# Altium footprint library Basal.PcbLib: 248 footprints (part 12 of 16)
Each footprint in its own frame and in the unit in brackets; x right, y up, seen from the top. Pads: shape width x height; smd on the part's side, far side on the other; paste and mask are expansions set on the pad; w line width, h text height; cw(c..) or ccw(c..) is an arc to the next point about the centre after c.
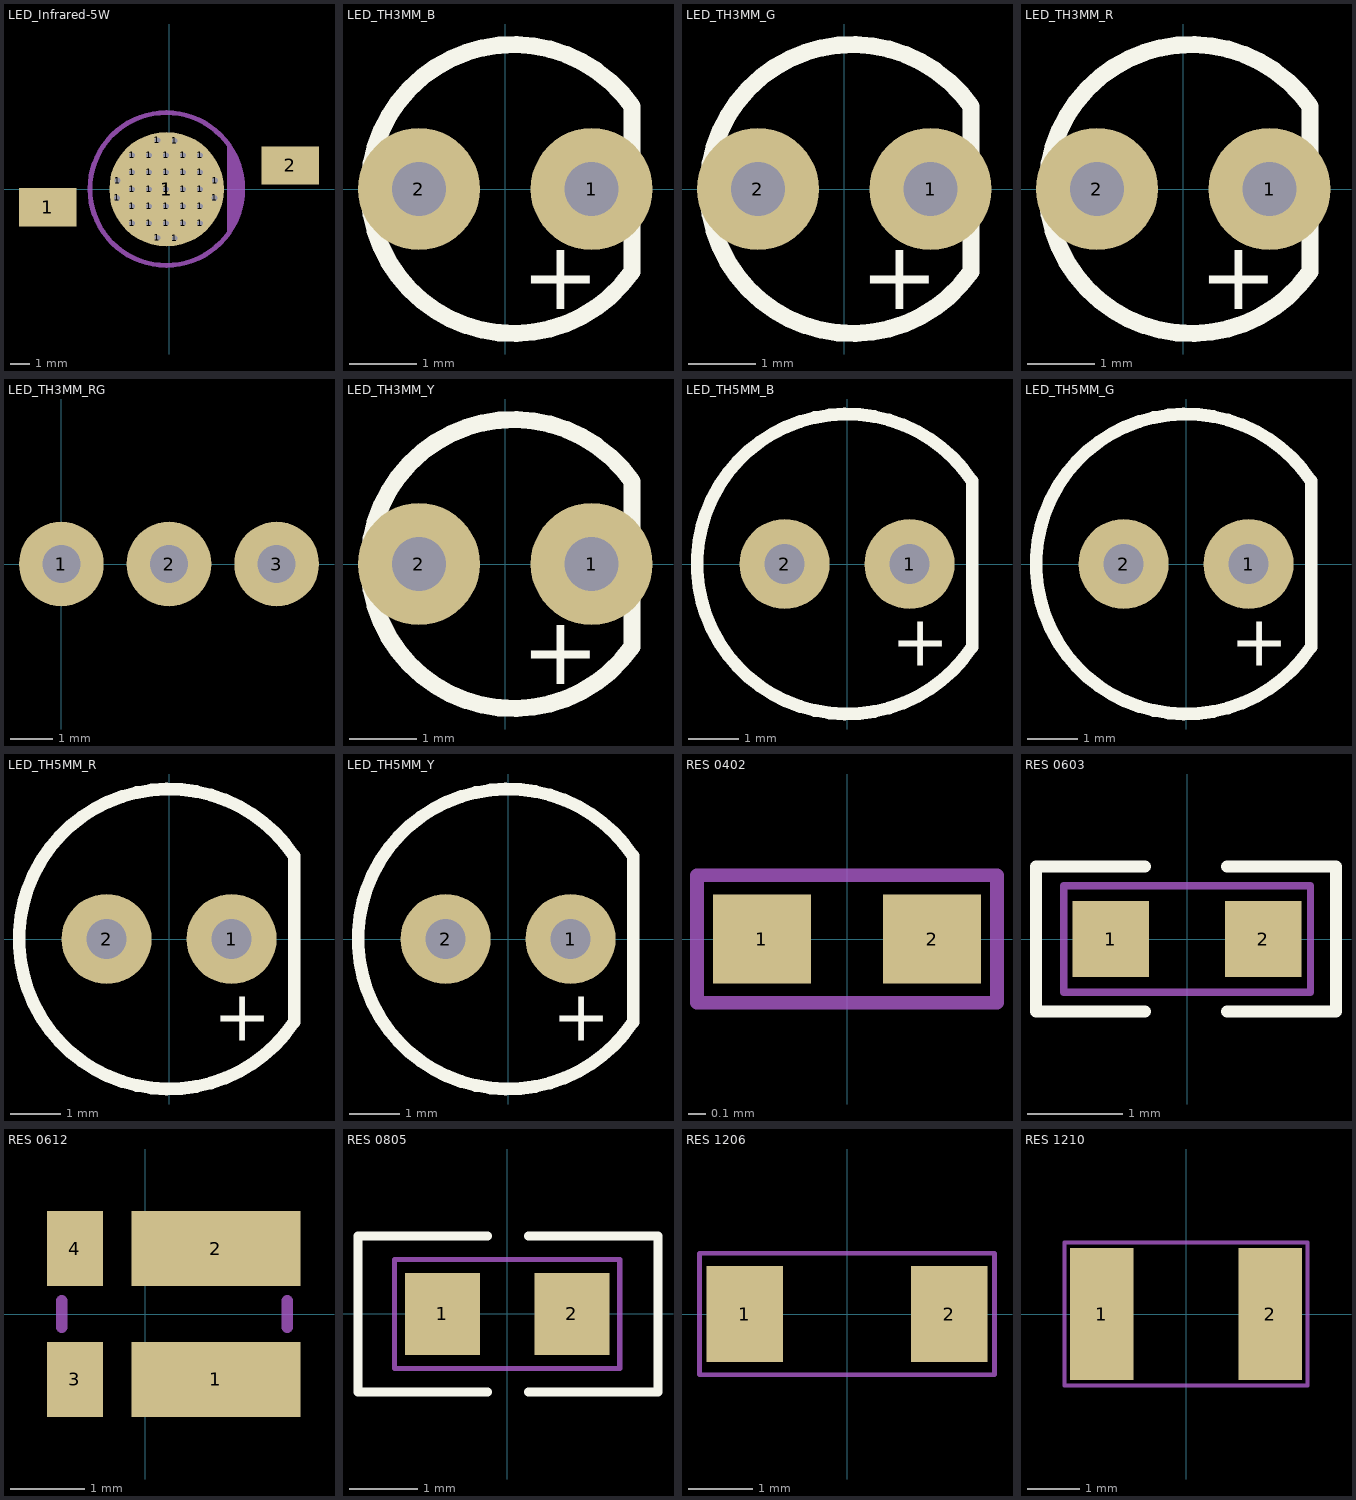
[diagram p11: the footprints below, top view; thin cyan lines are the x and y axes]

## LED_Infrared-5W [mil] "直插5MMLED_黄色"
pads (36):
  rect 118.11x78.74 smd: 1(-250.09,-37) 2(250.09,49)
  round 24 hole 12: 1(-107,-18) 1(-106,18) 1(-76,-70) 1(-76,-35) 1(-76,0) 1(-76,35) 1(-76,70) 1(-41,-70) 1(-41,-35) 1(-41,0) 1(-41,35) 1(-41,70) 1(-24,-100) 1(-24,101) 1(-6,-70) 1(-6,-35) 1(-6,0) 1(-6,35) 1(-6,70) 1(12,-101) 1(12,100) 1(29,-70) 1(29,-35) 1(29,0) 1(29,35) 1(29,70) 1(64,-70) 1(64,-35) 1(64,0) 1(64,35) 1(64,70) 1(94,-18) 1(95,18)
  round 236.22 smd: 1(-5,0)
Mechanical 15:
  circle w10: c-5.5,0.5 r157.48
  lines w10: 125,-87 125,88 ; 134,-72 134,73 ; 144,-49 144,50
  text "-" at 222.76,-67 h120
  text "+" at -277.64,-1 h120
3D body: height 59.45, standoff 47.24, extent 149.5,-64.75 165.5,-18.25
3D body: height 59.06, standoff 0, extent -226.09,-59.5 -210.09,-13.01
3D body: height 15.75, standoff 0, extent -290.09,-64.5 -210.09,-9.5
3D body: height 59.06, standoff 43.31, extent -164.5,-59.5 -115.5,60.5
3D body: height 59.06, standoff 43.31, extent 104.5,-71.25 169.5,72.25
3D body: height 102.36, standoff 0, extent -162.99,-156.94 151.98,157.93
3D body: height 236.22, standoff 15.75, extent -115.68,-109.71 104.69,110.71
3D body: height 59.06, standoff 43.31, extent -226.09,-59.5 -139.09,-13.01
3D body: height 59.06, standoff 43.31, extent 139.09,25.75 226.09,72.25
3D body: height 15.75, standoff 0, extent 210.09,21.5 290.09,76.5
3D body: height 59.06, standoff 0, extent 210.09,25.75 226.09,72.25

## LED_TH3MM_B [mm] "直插3MMLED_蓝色"
pads (2):
  round 1.8 hole 0.8: 1(1.275,0) 2(-1.275,0)
Top Overlay:
  lines w0.254: 1.871,-1.222 cw(c0.122,0) 1.873,1.218 1.871,-1.222
  text "+" at 0.238,-1.778 h1.02
3D body "BLUELED_3MM.STEP": height 2.5, standoff -8.6, extent -2.042,-2.001 1.625,1.999

## LED_TH3MM_G [mm] "直插3MMLED_绿色"
pads (2):
  round 1.8 hole 0.8: 1(1.275,0) 2(-1.275,0)
Top Overlay:
  lines w0.254: 1.871,-1.222 cw(c0.122,0) 1.873,1.218 1.871,-1.222
  text "+" at 0.238,-1.778 h1.02
3D body "GREENLED_3MM.STEP": height 2.5, standoff -8.6, extent -1.991,-1.975 1.676,2.025

## LED_TH3MM_R [mm] "直插3MMLED_红色"
pads (2):
  round 1.8 hole 0.8: 1(1.275,0) 2(-1.275,0)
Top Overlay:
  lines w0.254: 1.871,-1.222 cw(c0.122,0) 1.873,1.218 1.871,-1.222
  text "+" at 0.238,-1.778 h1.02
3D body "REDLED_3MM.STEP": height 8.1, standoff -3, extent -1.991,-2.001 1.676,1.999

## LED_TH3MM_RG [mm] "直插弯3MMLED_RG"
height 0.5
pads (3):
  round 2 hole 0.9: 1(0,0) 2(2.54,0) 3(5.08,0)
3D body "User Library-LED RG弯.STEP": height 4.1, standoff -1.65, extent 0.225,-0.249 4.725,8.681

## LED_TH3MM_Y [mm] "直插3MMLED_黄色"
pads (2):
  round 1.8 hole 0.8: 1(1.275,0) 2(-1.275,0)
Top Overlay:
  lines w0.254: 1.871,-1.222 cw(c0.122,0) 1.873,1.218 1.871,-1.222
  text "+" at 0.238,-1.778 h1.02
3D body "YELLOWLED_3MM.STEP": height 8.1, standoff -3, extent -1.991,-2.001 1.676,1.999

## LED_TH5MM_B [mm] "直插5MMLED_黄色"
pads (2):
  round 1.8 hole 0.8: 1(1.25,0) 2(-1.25,0)
Top Overlay:
  lines w0.254: 2.497,-1.658 cw(c-0.003,0) 2.497,1.658 ; 2.5,-1.66 2.5,1.66
  text "+" at 0.886,-2.032 h1.02
3D body "BLUE_5MM.STEP": height 12.6, standoff -3, extent -2.953,-2.946 2.947,2.954

## LED_TH5MM_G [mm] "直插5MMLED_绿色"
pads (2):
  round 1.8 hole 0.8: 1(1.25,0) 2(-1.25,0)
Top Overlay:
  lines w0.254: 2.497,-1.658 cw(c-0.003,0) 2.497,1.658 ; 2.5,-1.66 2.5,1.66
  text "+" at 0.886,-2.032 h1.02
3D body "GREENLED_5MM.STEP": height 12.6, standoff -3, extent -2.953,-2.921 2.947,2.979

## LED_TH5MM_R [mm] "直插5MMLED_红色、"
pads (2):
  round 1.8 hole 0.8: 1(1.25,0) 2(-1.25,0)
Top Overlay:
  lines w0.254: 2.497,-1.658 cw(c-0.003,0) 2.497,1.658 ; 2.5,-1.66 2.5,1.66
  text "+" at 0.886,-2.032 h1.02
3D body "REDLED_5MM.STEP": height 12.6, standoff -3, extent -2.953,-2.95 2.947,2.95

## LED_TH5MM_Y [mm] "直插5MMLED_黄色"
pads (2):
  round 1.8 hole 0.8: 1(1.25,0) 2(-1.25,0)
Top Overlay:
  lines w0.254: 2.497,-1.658 cw(c-0.003,0) 2.497,1.658 ; 2.5,-1.66 2.5,1.66
  text "+" at 0.886,-2.032 h1.02
3D body "YELLOWLED_5MM.STEP": height 12.6, standoff -3, extent -2.928,-2.976 2.972,2.924

## RES 0402 [mm] "贴片电阻0402封装"
height 0.3
pads (2):
  rect 0.55x0.5 smd: 1(-0.475,0) 2(0.475,0)
Mechanical 15:
  lines w0.076: -0.838,-0.356 -0.838,0.356 0.838,0.356 0.838,-0.356 -0.838,-0.356
3D body "R0402.STEP": height 0.36, standoff 0, extent -0.495,-0.254 0.495,0.254

## RES 0603 [mm] "贴片电阻0603封装"
height 0.4
pads (2):
  rect 0.8x0.8 smd paste-1: 1(-0.8,0) 2(0.8,0)
Top Overlay:
  lines w0.127: -0.443,-0.762 -1.586,-0.762 -1.586,0.762 -0.443,0.762 ; 0.421,-0.762 1.564,-0.762 1.564,0.762 0.421,0.762
Top Paste:
  region: -0.419,-0.15 -0.719,-0.368 -1.169,-0.368 -1.169,0.368 -0.719,0.368 -0.419,0.15
  region: 0.419,0.15 0.719,0.368 1.169,0.368 1.169,-0.368 0.719,-0.368 0.419,-0.15
Mechanical 15:
  lines w0.076: -1.295,-0.559 1.295,-0.559 1.295,0.559 -1.295,0.559 -1.295,-0.559
3D body "R0603.STEP": height 0.51, standoff 0, extent -0.8,-0.406 0.8,0.407

## RES 0612 [mm] "贴片电阻2512封装"
height 0.6
pads (4):
  rect 2.287x1.01 smd: 1(0.953,-0.885) 2(0.953,0.885)
  rect 0.762x1.01 smd: 3(-0.953,-0.885) 4(-0.953,0.885)
Mechanical 15:
  lines w0.152: -1.13,-0.18 -1.13,0.18 ; 1.92,-0.18 1.92,0.18
3D body "R0612.stp": height 0.65, standoff 0, extent -1.131,-0.825 1.919,0.825

## RES 0805 [mm] "贴片电阻0805封装"
height 0.5
pads (2):
  rect 1.1x1.2 smd paste-2: 1(-0.95,0) 2(0.95,0)
Top Overlay:
  lines w0.127: -0.282,-1.143 -2.187,-1.143 -2.187,1.143 -0.282,1.143 ; 0.307,-1.143 2.212,-1.143 2.212,1.143 0.307,1.143
Top Paste:
  region: -0.452,-0.459 -0.452,-0.479 -0.467,-0.515 -0.496,-0.544 -0.532,-0.559 -0.552,-0.559 -1.348,-0.559 -1.368,-0.559 -1.404,-0.544 -1.433,-0.515 -1.448,-0.479 -1.448,-0.459 -1.448,0.459 -1.448,0.479 -1.433,0.515 -1.404,0.544 -1.368,0.559 -1.348,0.559 -0.552,0.559 -0.532,0.559 -0.496,0.544 -0.467,0.515 -0.452,0.479 -0.452,0.459 -0.452,0.3 -0.452,0.28 -0.467,0.243 -0.496,0.215 -0.532,0.2 -0.552,0.2 -0.648,0.2 -0.687,0.196 -0.759,0.166 -0.814,0.111 -0.844,0.039 -0.844,-0.039 -0.814,-0.111 -0.759,-0.166 -0.687,-0.196 -0.648,-0.2 -0.552,-0.2 -0.532,-0.2 -0.496,-0.215 -0.467,-0.243 -0.452,-0.28 -0.452,-0.3
  region: 0.452,0.459 0.452,0.479 0.467,0.515 0.496,0.544 0.532,0.559 0.552,0.559 1.348,0.559 1.368,0.559 1.404,0.544 1.433,0.515 1.448,0.479 1.448,0.459 1.448,-0.459 1.448,-0.479 1.433,-0.515 1.404,-0.544 1.368,-0.559 1.348,-0.559 0.552,-0.559 0.532,-0.559 0.496,-0.544 0.467,-0.515 0.452,-0.479 0.452,-0.459 0.452,-0.3 0.452,-0.28 0.467,-0.243 0.496,-0.215 0.532,-0.2 0.552,-0.2 0.648,-0.2 0.687,-0.196 0.759,-0.166 0.814,-0.111 0.844,-0.039 0.844,0.039 0.814,0.111 0.759,0.166 0.687,0.196 0.648,0.2 0.552,0.2 0.532,0.2 0.496,0.215 0.467,0.243 0.452,0.28 0.452,0.3
Mechanical 15:
  lines w0.076: -1.651,-0.8 1.651,-0.8 1.651,0.8 -1.651,0.8 -1.651,-0.8
3D body "R0805.STEP": height 0.51, standoff 0, extent -1.003,-0.597 1.003,0.648

## RES 1206 [mm] "贴片电阻1206封装"
height 0.55
pads (2):
  rect 1.2x1.5 smd paste-3: 1(-1.6,0) 2(1.6,0)
Top Paste:
  region: -1.051,-0.611 -1.051,-0.631 -1.066,-0.668 -1.094,-0.696 -1.131,-0.711 -1.151,-0.711 -2.049,-0.711 -2.069,-0.711 -2.106,-0.696 -2.134,-0.668 -2.149,-0.631 -2.149,-0.611 -2.149,0.611 -2.149,0.631 -2.134,0.668 -2.106,0.696 -2.069,0.711 -2.049,0.711 -1.151,0.711 -1.131,0.711 -1.094,0.696 -1.066,0.668 -1.051,0.631 -1.051,0.611 -1.051,0.35 -1.051,0.33 -1.066,0.293 -1.094,0.265 -1.131,0.25 -1.151,0.25 -1.25,0.25 -1.299,0.245 -1.389,0.208 -1.458,0.139 -1.495,0.049 -1.495,-0.049 -1.458,-0.139 -1.389,-0.208 -1.299,-0.245 -1.25,-0.25 -1.151,-0.25 -1.131,-0.25 -1.094,-0.265 -1.066,-0.293 -1.051,-0.33 -1.051,-0.35
  region: 1.051,0.611 1.051,0.631 1.066,0.668 1.094,0.696 1.131,0.711 1.151,0.711 2.049,0.711 2.069,0.711 2.106,0.696 2.134,0.668 2.149,0.631 2.149,0.611 2.149,-0.611 2.149,-0.631 2.134,-0.668 2.106,-0.696 2.069,-0.711 2.049,-0.711 1.151,-0.711 1.131,-0.711 1.094,-0.696 1.066,-0.668 1.051,-0.631 1.051,-0.611 1.051,-0.35 1.051,-0.33 1.066,-0.293 1.094,-0.265 1.131,-0.25 1.151,-0.25 1.25,-0.25 1.299,-0.245 1.389,-0.208 1.458,-0.139 1.495,-0.049 1.495,0.049 1.458,0.139 1.389,0.208 1.299,0.245 1.25,0.25 1.151,0.25 1.131,0.25 1.094,0.265 1.066,0.293 1.051,0.33 1.051,0.35
Mechanical 15:
  lines w0.076: -2.311,-0.953 -2.311,0.953 2.311,0.953 2.311,-0.953 -2.311,-0.953
3D body "R1206.STEP": height 0.61, standoff 0, extent -1.562,-0.774 1.613,0.775

## RES 1210 [mm] "贴片电阻1210封装"
height 0.5
pads (2):
  rect 1.2x2.5 smd paste-3: 1(-1.6,0) 2(1.6,0)
Top Paste:
  region: -1.057,-1.1 -1.057,-1.12 -1.072,-1.157 -1.1,-1.185 -1.137,-1.2 -1.157,-1.2 -2.057,-1.2 -2.077,-1.2 -2.114,-1.185 -2.142,-1.157 -2.157,-1.12 -2.157,-1.1 -2.157,1.1 -2.157,1.12 -2.142,1.157 -2.114,1.185 -2.077,1.2 -2.057,1.2 -1.157,1.2 -1.137,1.2 -1.1,1.185 -1.072,1.157 -1.057,1.12 -1.057,1.1 -1.057,0.5 -1.057,0.48 -1.072,0.443 -1.1,0.415 -1.137,0.4 -1.157,0.4 -1.235,0.392 -1.379,0.333 -1.49,0.222 -1.549,0.078 -1.549,-0.078 -1.49,-0.222 -1.379,-0.333 -1.235,-0.392 -1.157,-0.4 -1.137,-0.4 -1.1,-0.415 -1.072,-0.443 -1.057,-0.48 -1.057,-0.5
  region: 1.057,1.1 1.057,1.12 1.072,1.157 1.1,1.185 1.137,1.2 1.157,1.2 2.057,1.2 2.077,1.2 2.114,1.185 2.142,1.157 2.157,1.12 2.157,1.1 2.157,-1.1 2.157,-1.12 2.142,-1.157 2.114,-1.185 2.077,-1.2 2.057,-1.2 1.157,-1.2 1.137,-1.2 1.1,-1.185 1.072,-1.157 1.057,-1.12 1.057,-1.1 1.057,-0.5 1.057,-0.48 1.072,-0.443 1.1,-0.415 1.137,-0.4 1.157,-0.4 1.235,-0.392 1.379,-0.333 1.49,-0.222 1.549,-0.078 1.549,0.078 1.49,0.222 1.379,0.333 1.235,0.392 1.157,0.4 1.137,0.4 1.1,0.415 1.072,0.443 1.057,0.48 1.057,0.5
Mechanical 15:
  lines w0.076: -2.311,-1.359 -2.311,1.359 2.311,1.359 2.311,-1.359 -2.311,-1.359
3D body "R1210.STEP": height 0.61, standoff 0, extent -1.6,-1.295 1.6,1.296